# Altium footprint library MH_DA_THU_VIEN_16122016.PcbLib: 531 footprints (part 33 of 34)
Each footprint in its own frame and in the unit in brackets; x right, y up, seen from the top. Pads: shape width x height; smd on the part's side, far side on the other; paste and mask are expansions set on the pad; w line width, h text height; cw(c..) or ccw(c..) is an arc to the next point about the centre after c.
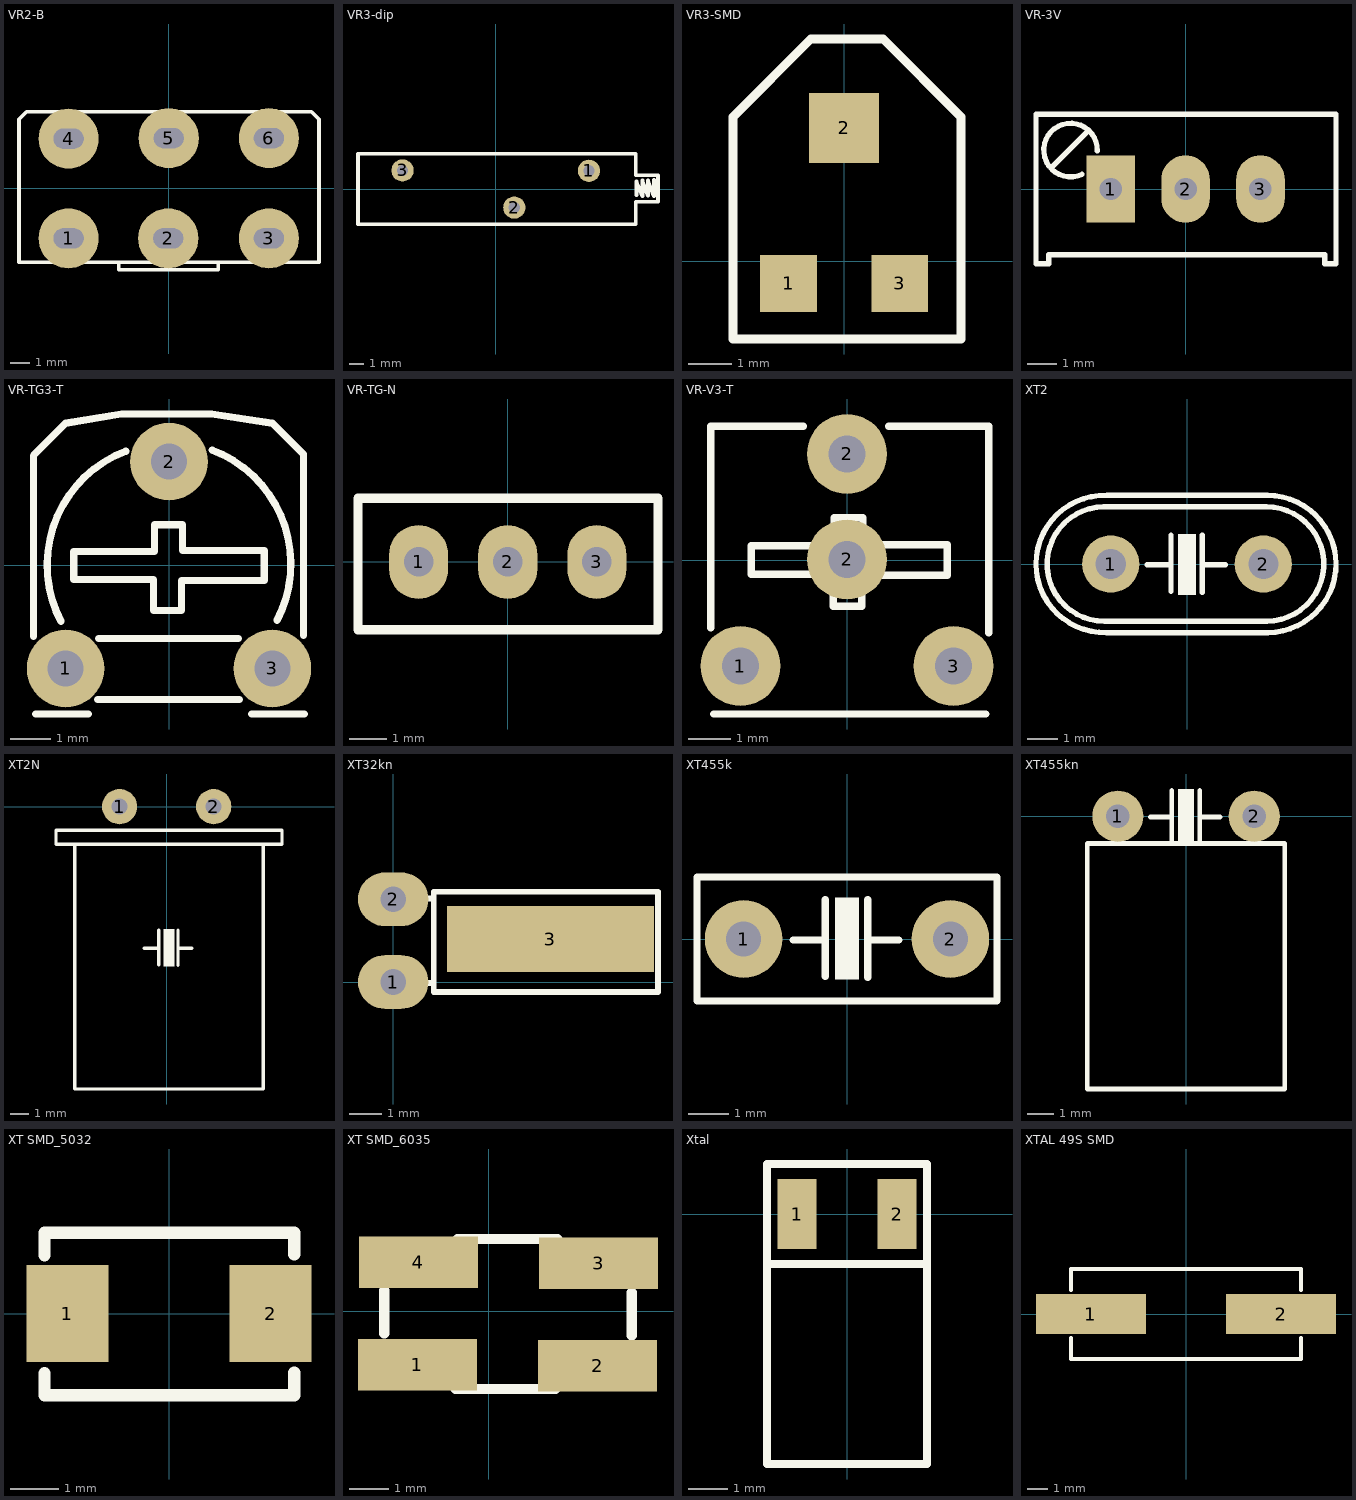
[diagram p32: the footprints below, top view; thin cyan lines are the x and y axes]

## VR2-B [mil]
pads (6):
  round 120 hole 40 slot 60 at 0 deg: 1(-200,-100) 2(-1,-100) 3(200,-100) 4(-200,99) 5(0,100) 6(200,100)
Top Overlay:
  lines w7: -100,-148 -100,-163 99,-163 99,-148 ; -299,-148 -299,138 -284,153 285,153 300,138 300,-148 -299,-148
3D body: height 834.65, standoff -129.92, extent -338.65,-1409.27 330.65,199

## VR3-dip [mil]
pads (3):
  round 60 hole 30: 1(251,49) 2(50,-50) 3(-251,50)
Top Overlay:
  lines w10: 376,95 -371,95 -371,-95 376,-95 377,-95 377,-34 437,-34 437,37 377,37 377,95 ; 379,-17 379,20 395,-19 395,23 410,-18 410,23 426,-19 426,24
3D body: height 250.6, standoff -209.24, extent -370.92,-95 438.92,95.16

## VR3-SMD [mm]
pads (3):
  rect 1.3x1.3 smd: 1(-1.27,-0.508) 3(1.27,-0.508)
  rect 1.6x1.6 smd: 2(0,3.048)
Top Overlay:
  lines w0.203: -2.54,-1.778 2.667,-1.778 2.667,3.302 0.889,5.08 -0.762,5.08 -2.54,3.302 -2.54,-1.27 -2.54,-1.778

## VR-3V [mil]
pads (3):
  rect 65x90 hole 30: 1(-100,0)
  oval 65x90 hole 30: 2(0,0) 3(100,0)
Top Overlay:
  lines w7: -180,28 -130,78 ; -138.6,19.63 cw(c-153.79,52.05) -118.01,50.77 ; -200,-100 -200,100 201,100 201,-100 186,-100 186,-88 -183,-88 -183,-100 -200,-100
3D body: height 455, standoff -45, extent -187.5,-130 187.5,110

## VR-TG3-T [mil]
pads (3):
  round 75 hole 35: 1(-100,-100) 2(0,100) 3(100,-100)
Top Overlay:
  lines w7: -131,-69 -131,106 -100,137 -46,146 41.5,146 100,137 130,107 130,-68 ; -129,-144 -78,-144 ; -104.35,-54.66 cw(c0,0) -41.9,110.1 ; -92,13 -92,-14 -15,-14 -15,-44 12,-44 12,-15 92,-15 92,14 13,14 13,39 -14,39 -14,13 -91,13 ; -69,-130 68,-130 ; -68,-71 67,-71 ; 41.9,111.1 cw(c0,1) 104.35,-53.66 ; 80,-144 131,-144
3D body: height 278.74, standoff -150.39, extent -127.95,-149.68 127.95,127.88

## VR-TG-N [mm]
pads (3):
  oval 1.6x2 hole 0.8: 1(-2.413,0) 2(0,0) 3(2.413,0)
Top Overlay:
  lines w0.254: -4.057,-1.834 4.071,-1.834 4.071,1.722 -4.057,1.722 -4.057,-1.834

## VR-V3-T [mil]
pads (4):
  round 75 hole 35: 1(-100,-99.5) 2(0,0.5) 2(0,99.5) 3(100,-99.5)
Top Overlay:
  lines w7: -128,-63.5 -128,105.5 ; -128,106.5 -128,125.5 -41,125.5 ; -125,-144.5 -75,-144.5 ; -90,13.5 -90,-13.5 -13,-13.5 -13,-43.5 14,-43.5 14,-14.5 94,-14.5 94,14.5 15,14.5 15,39.5 -12,39.5 -12,13.5 -89,13.5 ; -76,-144.5 85,-144.5 ; 39,125.5 133,125.5 133,106.5 133,-68.5 ; 83,-144.5 130,-144.5
3D body: height 278.74, standoff -150.39, extent -125.96,-145.18 129.95,132.38

## XT2 [mm] "Footpin for Crystal 2 pin"
pads (2):
  round 1.905 hole 1: 1(-2.54,0) 2(2.54,0)
Top Overlay:
  region: 0.292,0.991 0.292,-1.016 -0.292,-1.016 -0.292,0.991
  lines w0.178: -2.769,1.905 ccw(c-2.756,0) -2.75,-1.905 ; -2.717,-1.905 2.617,-1.905 ; -2.692,1.905 2.642,1.905 ; -2.668,-2.286 2.69,-2.286 ccw(c2.675,0) 2.668,2.286 -2.666,2.286 ccw(c-2.743,0.001) -2.668,-2.283 ; -1.321,-0.025 -0.533,-0.025 ; -0.533,-0.914 -0.533,0.965 ; 0.508,-0.94 0.508,0.965 ; 0.508,-0.025 1.27,-0.025 ; 2.642,1.905 cw(c2.647,0) 2.66,-1.905
3D body: height 3.5, standoff -4, extent -5.929,-2.364 5.421,2.286

## XT2N [mil] "Crystal 2pin, high 200 mil"
height 200
pads (2):
  round 75 hole 34: 1(-100,0) 2(100,0)
Top Overlay:
  region: 16.5,-260 16.5,-339 -6.5,-339 -6.5,-260
  lines w7: -48,-301 -17,-301 ; -17,-336 -17,-262 ; 24,-337 24,-262 ; 24,-301 54,-301 ; -235,-80 -195,-80 ; -235,-80 -235,-50 ; -235,-80 -195,-80 ; -235,-80 -235,-50 ; -235,-50 245,-50 ; -235,-50 245,-50 ; -195,-600 -195,-80 ; -195,-600 205,-600 ; -195,-600 -195,-80 ; -195,-600 205,-600 ; -195,-80 205,-80 ; -195,-80 205,-80 ; 205,-600 205,-80 ; 205,-600 205,-80 ; 205,-80 245,-80 ; 205,-80 245,-80 ; 245,-80 245,-50 ; 245,-80 245,-50
3D body: height 91.44, standoff -92.52, extent -209.86,-594.33 230,14.33

## XT32kn [mil] "Crystal for 32,768kHz, 2pin"
height 150
pads (3):
  oval 85x65 hole 31: 1(0,0) 2(0,100)
  rect 250x80 smd: 3(190,52)
Top Overlay:
  lines w7: 34,-1 49,-1 ; 35,101 49,101 ; 49,101 49,-12 320,-12 320,109 49,109 49,101
3D body: height 78.74, standoff -18.54, extent -6.97,-4.99 342.97,107

## XT455k [mil] "Thach anh 455khz (Infrared)"
pads (2):
  round 75 hole 34: 1(-100,0) 2(100,0)
Top Overlay:
  region: 11.5,40 11.5,-39 -11.5,-39 -11.5,40
  lines w7: -52,-1 -21,-1 ; -21,-36 -21,38 ; 20,-37 20,38 ; 20,-1 50,-1 ; -145,-60 -145,60 145,60 145,-60 -145,-60
3D body: height 519.68, standoff -78.74, extent -217.53,-87.58 215.54,89.59

## XT455kn [mil] "Thach anh 455khz (Infrared)"
pads (2):
  round 75 hole 34: 1(-100,0) 2(100,0)
Top Overlay:
  region: 11.5,40 11.5,-39 -11.5,-39 -11.5,40
  lines w7: -52,-1 -21,-1 ; -21,-36 -21,38 ; 20,-37 20,38 ; 20,-1 50,-1 ; -145,-400 -145,-40 145,-40 145,-400 -145,-400

## XT SMD_5032 [mm]
pads (2):
  rect 1.7x2 smd: 1(-2.095,0) 2(2.095,0)
Top Overlay:
  lines w0.254: -2.568,-1.235 -2.568,-1.685 2.582,-1.685 2.582,-1.223 ; -2.568,1.204 -2.568,1.665 2.582,1.665 2.582,1.223
3D body: height 1.3, standoff 0, extent -2.513,-1.6 2.487,1.6

## XT SMD_6035 [mm]
pads (4):
  rect 3x1.3 smd: 1(-1.803,-1.346) 2(2.743,-1.372) 3(2.769,1.219) 4(-1.778,1.245)
Top Overlay:
  lines w0.254: -2.642,-0.559 -2.642,0.533 ; -0.838,-1.956 1.676,-1.956 ; -0.787,1.829 1.727,1.829 ; 3.607,-0.61 3.607,0.483
3D body: height -0.05, standoff -1.36, extent -3.017,-2.525 3.983,2.475

## Xtal [mm] "thach anh dan loai nho"
height 0.6
pads (2):
  rect 1x1.778 smd: 1(-1.27,0) 2(1.27,0)
Top Overlay:
  lines w0.2: -2.032,-1.27 2.032,-1.27 ; -2.032,-6.35 -2.032,-5.588 -2.032,1.27 2.032,1.27 2.032,-6.35 -2.032,-6.35

## XTAL 49S SMD [mm]
pads (2):
  rect 5.5x2 smd: 1(-4.75,0) 2(4.75,0)
Top Overlay:
  lines w0.178: -5.75,-1.2 -5.75,-2.25 5.75,-2.25 5.75,-1.2 ; -5.75,1.2 -5.75,2.25 5.75,2.25 5.75,1.2
3D body: height 4.31, standoff -0.04, extent -6.15,-2.35 6.15,2.35